# Altium footprint library MOLEX THD.PcbLib: 71 footprints (part 2 of 5)
Each footprint in its own frame and in the unit in brackets; x right, y up, seen from the top. Pads: shape width x height; smd on the part's side, far side on the other; paste and mask are expansions set on the pad; w line width, h text height; cw(c..) or ccw(c..) is an arc to the next point about the centre after c.
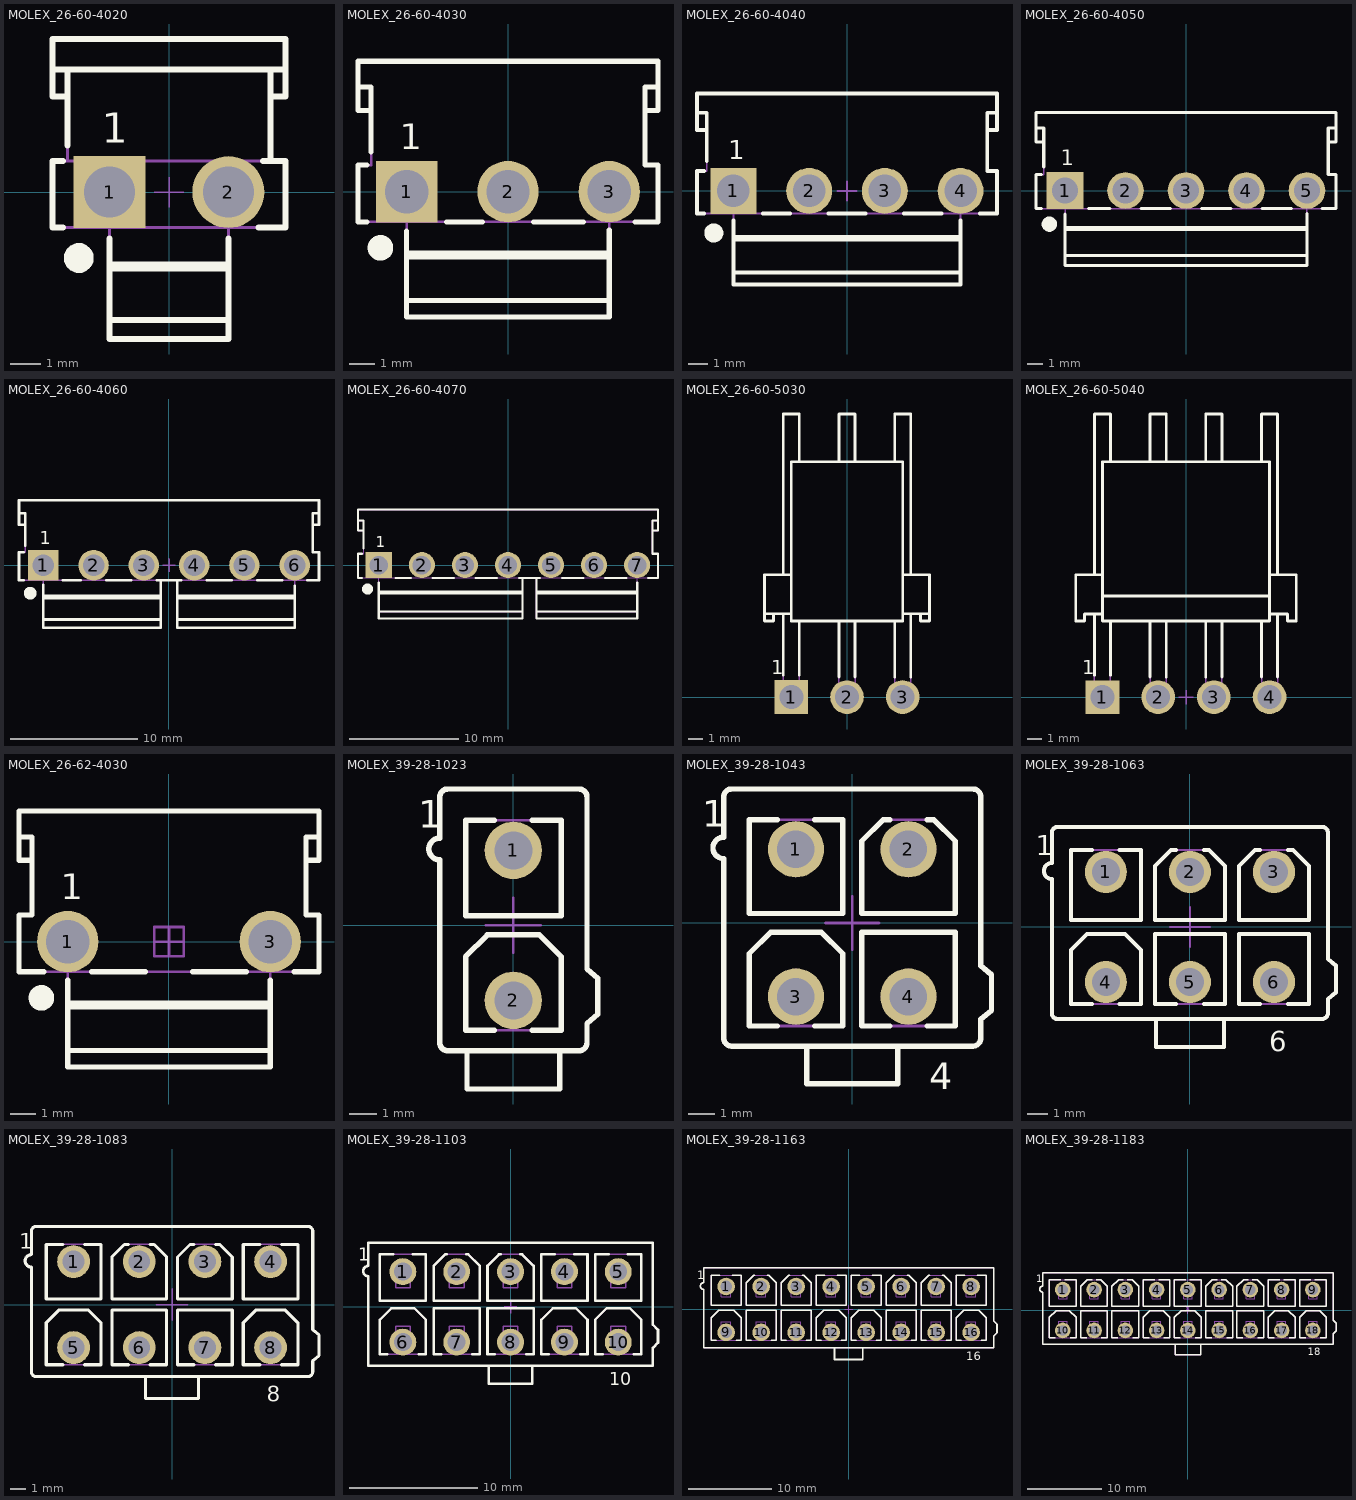
[diagram p1: the footprints below, top view; thin cyan lines are the x and y axes]

## MOLEX_26-60-4020 [mm] "3.96mm (.156\") Pitch KK® Solid Header, Vertical, Friction Lock, 2 Circuits, Tin (Sn) Plating"
height 14.73
pads (2):
  rect 2.4x2.4 hole 1.7: 1(-1.981,0)
  round 2.4 hole 1.7: 2(1.981,0)
Top Overlay:
  circle w0.5: c-3.011,-2.2 r0.25
  lines w0.2: -3.886,4.089 3.886,4.089 ; -3.531,-1.181 -3.886,-1.181 -3.886,1.041 -3.531,1.041 ; -3.378,1.55 -3.378,4.089 ; -3.378,3.182 -3.886,3.182 -3.886,5.105 3.886,5.105 3.886,3.182 3.378,3.182 ; -1.981,-4.267 1.981,-4.267 ; -1.981,-2.548 1.981,-2.548 ; -1.981,-2.413 1.981,-2.413 ; -1.981,-1.55 -1.981,-4.902 1.981,-4.902 1.981,-1.55 ; 2.985,-1.181 3.886,-1.181 3.886,1.041 3.129,1.041 ; 3.378,1.041 3.378,4.089
  text "1" at -2.249,1.65 h1
Mechanical 8:
  lines w0.05: -2.481,0 -1.981,0 ; -1.981,-0.5 -1.981,0 ; -1.981,0.5 -1.981,0 ; -1.481,0 -1.981,0 ; -0.5,0 0,0 ; 0,-0.5 0,0 ; 0,0.5 0,0 ; 0.5,0 0,0 ; 1.481,0 1.981,0 ; 1.981,-0.5 1.981,0 ; 1.981,0.5 1.981,0 ; 2.481,0 1.981,0
Mechanical 14:
  lines w0.1: -3.886,4.089 3.886,4.089 ; -3.378,1.041 -3.378,4.089 ; -3.378,3.182 -3.886,3.182 -3.886,5.105 3.886,5.105 3.886,3.182 3.378,3.182 ; -1.981,-4.267 1.981,-4.267 ; -1.981,-2.548 1.981,-2.548 ; -1.981,-2.413 1.981,-2.413 ; -1.981,-1.181 -1.981,-4.902 1.981,-4.902 1.981,-1.181 ; 3.378,1.041 3.378,4.089 ; -3.886,-1.181 -3.886,1.041 3.886,1.041 3.886,-1.181 -3.886,-1.181 ; -2.552,-0.571 -2.552,0.571 -1.41,0.571 -1.41,-0.571 -2.552,-0.571 ; 1.408,-0.571 1.408,0.571 2.55,0.571 2.55,-0.571 1.408,-0.571
  text "1" at -2.249,1.65 h1
3D body "MOLEX_26-60-4020.stp": height 14.73, standoff -3.56, extent -3.886,-4.902 3.886,5.105

## MOLEX_26-60-4030 [mm] "3.96mm (.156\") Pitch KK® Solid Header, Vertical, Friction Lock, 3 Circuits, Tin (Sn) Plating"
height 14.73
pads (3):
  rect 2.4x2.4 hole 1.7: 1(-3.96,0)
  round 2.4 hole 1.7: 2(0,0) 3(3.96,0)
Top Overlay:
  circle w0.5: c-4.99,-2.2 r0.25
  lines w0.2: -5.869,4.089 -5.361,4.089 -5.361,3.181 ; -5.869,5.105 -5.869,3.181 -5.361,3.181 ; -5.864,5.102 5.864,5.102 5.864,3.18 5.356,3.18 ; -5.51,-1.181 -5.869,-1.181 -5.869,1.041 -5.51,1.041 ; -5.361,1.55 -5.361,3.181 ; -3.964,-4.898 -3.964,-1.55 ; -3.96,-4.899 3.96,-4.899 3.96,-1.5 ; -3.96,-4.265 3.96,-4.265 ; -3.96,-2.546 3.96,-2.546 ; -3.96,-2.412 3.96,-2.412 ; -2.41,-1.181 -1.003,-1.181 ; 1.003,-1.181 2.957,-1.181 ; 4.963,-1.181 5.869,-1.181 ; 5.864,-1.18 5.864,1.041 5.356,1.041 5.356,4.087 5.864,4.087
  text "1" at -4.228,1.65 h1
Mechanical 8:
  lines w0.1: -4.46,0 -3.96,0 ; -3.96,-0.5 -3.96,0 ; -3.96,0.5 -3.96,0 ; -3.46,0 -3.96,0 ; -0.5,0 0,0 ; 0,-0.5 0,0 ; 0,0.5 0,0 ; 0.5,0 0,0 ; 3.46,0 3.96,0 ; 3.96,-0.5 3.96,0 ; 3.96,0.5 3.96,0 ; 4.46,0 3.96,0
Mechanical 14:
  lines w0.1: -5.864,4.087 -5.356,4.087 -5.356,1.041 -5.864,1.041 -5.864,-1.18 5.864,-1.18 5.864,1.041 5.356,1.041 5.356,4.087 5.864,4.087 ; -5.356,3.18 -5.864,3.18 -5.864,5.102 5.864,5.102 5.864,3.18 5.356,3.18 ; -3.96,-4.265 3.96,-4.265 ; -3.96,-2.546 3.96,-2.546 ; -3.96,-2.412 3.96,-2.412 ; -3.96,-1.18 -3.96,-4.899 3.96,-4.899 3.96,-1.18 ; -4.531,-0.571 -4.531,0.571 -3.389,0.571 -3.389,-0.571 -4.531,-0.571 ; -0.571,-0.571 -0.571,0.571 0.571,0.571 0.571,-0.571 -0.571,-0.571 ; 3.389,-0.571 3.389,0.571 4.531,0.571 4.531,-0.571 3.389,-0.571
  text "1" at -4.228,1.65 h1
3D body "MOLEX_26-60-4030.stp": height 14.73, standoff -3.56, extent -5.864,-4.899 5.871,5.108

## MOLEX_26-60-4040 [mm] "3.96mm (.156\") Pitch KK® Solid Header, Vertical, Friction Lock, 4 Circuits, Tin (Sn) Plating"
height 14.73
pads (4):
  rect 2.4x2.4 hole 1.7: 1(-5.94,0)
  round 2.4 hole 1.7: 2(-1.98,0) 3(1.98,0) 4(5.94,0)
Top Overlay:
  circle w0.5: c-6.97,-2.2 r0.25
  lines w0.2: -7.849,4.089 -7.341,4.089 -7.341,3.181 ; -7.49,-1.181 -7.849,-1.181 -7.849,1.041 -7.49,1.041 ; -7.341,1.55 -7.341,3.181 ; -5.944,-4.268 5.944,-4.268 ; -5.944,-2.548 5.944,-2.548 ; -5.944,-2.413 5.944,-2.413 ; -5.944,-1.55 -5.944,-4.898 5.944,-4.903 5.944,-1.55 ; -4.39,-1.181 -2.983,-1.181 ; -0.977,-1.181 0.977,-1.181 ; 2.983,-1.181 4.937,-1.181 ; 6.943,-1.181 7.849,-1.181 7.849,1.041 7.341,1.041 7.341,3.181 ; 7.849,4.089 7.341,4.089 7.341,3.181 ; -7.341,3.181 -7.849,3.181 -7.849,5.105 7.849,5.105 7.849,3.181 7.341,3.181
  text "1" at -6.208,1.65 h1
Mechanical 8:
  lines w0.1: -6.44,0 -5.94,0 ; -5.94,-0.5 -5.94,0 ; -5.94,0.5 -5.94,0 ; -5.44,0 -5.94,0 ; -2.48,0 -1.98,0 ; -1.98,-0.5 -1.98,0 ; -1.98,0.5 -1.98,0 ; -1.48,0 -1.98,0 ; -0.5,0 0,0 ; 0,-0.5 0,0 ; 0,0.5 0,0 ; 0.5,0 0,0 ; 1.48,0 1.98,0 ; 1.98,-0.5 1.98,0 ; 1.98,0.5 1.98,0 ; 2.48,0 1.98,0 ; 5.44,0 5.94,0 ; 5.94,-0.5 5.94,0 ; 5.94,0.5 5.94,0 ; 6.44,0 5.94,0
Mechanical 14:
  lines w0.1: -7.849,4.089 -7.341,4.089 -7.341,3.181 ; -5.944,-4.268 5.944,-4.268 ; -5.944,-2.548 5.944,-2.548 ; -5.944,-2.413 5.944,-2.413 ; 7.849,4.089 7.341,4.089 7.341,3.181 ; -7.341,3.181 -7.849,3.181 -7.849,5.105 7.849,5.105 7.849,3.181 7.341,3.181 ; -7.341,3.181 -7.341,1.041 -7.849,1.041 -7.849,-1.181 -5.944,-1.181 ; -5.944,-1.181 5.944,-1.181 ; -5.944,-1.181 -5.944,-4.898 5.944,-4.903 5.944,-1.181 ; 5.944,-1.181 7.849,-1.181 7.849,1.041 7.341,1.041 7.341,3.181
  text "1" at -6.208,1.65 h1
3D body "MOLEX_26-60-4040.stp": height 14.73, standoff -3.54, extent -7.849,-4.902 7.849,5.105

## MOLEX_26-60-4050 [mm] "3.96mm (.156\") Pitch KK® Solid Header, Vertical, Friction Lock, 5 Circuits, Tin (Sn) Plating"
height 14.73
pads (5):
  rect 2.4x2.4 hole 1.7: 1(-7.92,0)
  round 2.4 hole 1.7: 2(-3.96,0) 3(0,0) 4(3.96,0) 5(7.92,0)
Top Overlay:
  circle w0.5: c-8.95,-2.2 r0.25
  lines w0.2: -9.824,4.087 -9.316,4.087 -9.316,1.55 ; -9.47,-1.18 -9.824,-1.18 -9.824,1.041 -9.47,1.041 ; -9.316,3.18 -9.824,3.18 -9.824,5.102 9.824,5.102 9.824,3.18 9.316,3.18 ; -7.92,-4.265 7.92,-4.265 ; -7.92,-2.546 7.92,-2.546 ; -7.92,-2.412 7.92,-2.412 ; -7.92,-1.55 -7.92,-4.899 7.92,-4.899 7.92,-1.5 ; -6.37,-1.18 -4.965,-1.18 ; -2.955,-1.18 -1.005,-1.18 ; 1.005,-1.18 2.955,-1.18 ; 4.965,-1.18 6.915,-1.18 ; 8.925,-1.18 9.824,-1.18 9.824,1.041 9.316,1.041 9.316,4.087 9.824,4.087
  text "1" at -8.188,1.65 h1
Mechanical 8:
  lines w0.1: -8.42,0 -7.92,0 ; -7.92,-0.5 -7.92,0 ; -7.92,0.5 -7.92,0 ; -7.42,0 -7.92,0 ; -4.46,0 -3.96,0 ; -3.96,-0.5 -3.96,0 ; -3.96,0.5 -3.96,0 ; -3.46,0 -3.96,0 ; -0.5,0 0,0 ; 0,-0.5 0,0 ; 0,0.5 0,0 ; 0.5,0 0,0 ; 3.46,0 3.96,0 ; 3.96,-0.5 3.96,0 ; 3.96,0.5 3.96,0 ; 4.46,0 3.96,0 ; 7.42,0 7.92,0 ; 7.92,-0.5 7.92,0 ; 7.92,0.5 7.92,0 ; 8.42,0 7.92,0
Mechanical 14:
  lines w0.1: -9.824,4.087 -9.316,4.087 -9.316,1.041 -9.824,1.041 -9.824,-1.18 9.824,-1.18 9.824,1.041 9.316,1.041 9.316,4.087 9.824,4.087 ; -9.316,3.18 -9.824,3.18 -9.824,5.102 9.824,5.102 9.824,3.18 9.316,3.18 ; -7.92,-4.265 7.92,-4.265 ; -7.92,-2.546 7.92,-2.546 ; -7.92,-2.412 7.92,-2.412 ; -7.92,-1.18 -7.92,-4.899 7.92,-4.899 7.92,-1.18 ; -8.491,-0.571 -7.349,-0.571 -7.349,0.571 -8.491,0.571 -8.491,-0.571 ; -4.531,-0.571 -3.389,-0.571 -3.389,0.571 -4.531,0.571 -4.531,-0.571 ; -0.571,-0.571 0.571,-0.571 0.571,0.571 -0.571,0.571 -0.571,-0.571 ; 3.389,-0.571 4.531,-0.571 4.531,0.571 3.389,0.571 3.389,-0.571 ; 7.349,-0.571 8.491,-0.571 8.491,0.571 7.349,0.571 7.349,-0.571
  text "1" at -8.188,1.65 h1
3D body "MOLEX_26-60-4050.stp": height 14.72, standoff -3.55, extent -9.824,-4.899 9.824,5.102

## MOLEX_26-60-4060 [mm] "3.96mm (.156\") Pitch KK® Solid Header, Vertical, Friction Lock, 6 Circuits, Tin (Sn) Plating"
height 14.73
pads (6):
  rect 2.4x2.4 hole 1.7: 1(-9.9,0)
  round 2.4 hole 1.7: 2(-5.94,0) 3(-1.98,0) 4(1.98,0) 5(5.94,0) 6(9.9,0)
Top Overlay:
  circle w0.5: c-10.93,-2.2 r0.25
  lines w0.2: -11.811,4.089 -11.303,4.089 -11.303,1.55 ; -11.45,-1.181 -11.811,-1.181 -11.811,1.041 -11.45,1.041 ; -11.303,3.182 -11.811,3.182 -11.811,3.216 -11.811,5.105 11.811,5.105 11.811,3.182 11.303,3.182 ; -9.906,-4.267 -0.635,-4.267 ; -9.906,-2.599 -0.635,-2.599 ; -9.906,-2.413 -0.635,-2.413 ; -9.906,-1.55 -9.906,-4.902 -0.635,-4.902 -0.635,-1.181 ; -8.35,-1.181 -6.944,-1.181 ; -4.936,-1.181 -2.984,-1.181 ; -0.976,-1.181 0.976,-1.181 ; 0.635,-4.267 9.906,-4.267 ; 0.635,-2.599 9.906,-2.599 ; 0.635,-2.413 9.906,-2.413 ; 0.635,-1.181 0.635,-4.902 9.906,-4.902 9.906,-1.6 ; 2.984,-1.181 4.936,-1.181 ; 6.944,-1.181 8.896,-1.181 ; 10.904,-1.181 11.811,-1.181 11.811,1.041 11.303,1.041 11.303,4.089 11.811,4.089
  text "1" at -10.168,1.65 h1
Mechanical 8:
  lines w0.1: -10.4,0 -9.9,0 ; -9.9,-0.5 -9.9,0 ; -9.9,0.5 -9.9,0 ; -9.4,0 -9.9,0 ; -6.44,0 -5.94,0 ; -5.94,-0.5 -5.94,0 ; -5.94,0.5 -5.94,0 ; -5.44,0 -5.94,0 ; -2.48,0 -1.98,0 ; -1.98,-0.5 -1.98,0 ; -1.98,0.5 -1.98,0 ; -1.48,0 -1.98,0 ; -0.5,0 0,0 ; 0,-0.5 0,0 ; 0,0.5 0,0 ; 0.5,0 0,0 ; 1.48,0 1.98,0 ; 1.98,-0.5 1.98,0 ; 1.98,0.5 1.98,0 ; 2.48,0 1.98,0 ; 5.44,0 5.94,0 ; 5.94,-0.5 5.94,0 ; 5.94,0.5 5.94,0 ; 6.44,0 5.94,0 ; 9.4,0 9.9,0 ; 9.9,-0.5 9.9,0 ; 9.9,0.5 9.9,0 ; 10.4,0 9.9,0
Mechanical 14:
  lines w0.1: -11.811,4.089 -11.303,4.089 -11.303,1.041 -11.811,1.041 -11.811,-1.181 11.811,-1.181 11.811,1.041 11.303,1.041 11.303,4.089 11.811,4.089 ; -11.303,3.182 -11.811,3.182 -11.811,3.216 -11.811,5.105 11.811,5.105 11.811,3.182 11.303,3.182 ; -9.906,-4.267 -0.635,-4.267 ; -9.906,-2.599 -0.635,-2.599 ; -9.906,-2.413 -0.635,-2.413 ; -9.906,-1.181 -9.906,-4.902 -0.635,-4.902 -0.635,-1.181 ; 0.635,-4.267 9.906,-4.267 ; 0.635,-2.599 9.906,-2.599 ; 0.635,-2.413 9.906,-2.413 ; 0.635,-1.181 0.635,-4.902 9.906,-4.902 9.906,-1.181 ; -10.477,-0.572 -9.334,-0.572 -9.334,0.572 -10.477,0.572 -10.477,-0.572 ; -6.515,-0.572 -5.372,-0.572 -5.372,0.572 -6.515,0.572 -6.515,-0.572 ; -2.553,-0.572 -1.41,-0.572 -1.41,0.572 -2.553,0.572 -2.553,-0.572 ; 1.41,-0.572 2.553,-0.572 2.553,0.572 1.41,0.572 1.41,-0.572 ; 5.372,-0.572 6.515,-0.572 6.515,0.572 5.372,0.572 5.372,-0.572 ; 9.335,-0.572 10.478,-0.572 10.478,0.572 9.335,0.572 9.335,-0.572
  text "1" at -10.168,1.65 h1
3D body "MOLEX_26-60-4060.stp": height 14.73, standoff -3.56, extent -11.811,-4.902 11.811,5.106

## MOLEX_26-60-4070 [mm] "3.96mm (.156\") Pitch KK® Solid Header, Vertical, Friction Lock, 7 Circuits, Tin (Sn) Plating"
height 14.73
pads (7):
  rect 2.4x2.4 hole 1.7: 1(-11.887,0)
  round 2.4 hole 1.7: 2(-7.927,0) 3(-3.967,0) 4(-0.007,0) 5(3.953,0) 6(7.913,0) 7(11.875,0)
Top Overlay:
  circle w0.5: c-12.917,-2.2 r0.25
  lines w0.2: -13.799,4.089 -13.291,4.089 -13.291,1.55 ; -13.444,-1.181 -13.799,-1.181 -13.799,1.041 -13.444,1.041 ; -13.291,3.182 -13.799,3.182 -13.799,5.105 13.785,5.105 13.785,3.182 13.277,3.182 ; -11.894,-4.267 1.339,-4.267 ; -11.894,-2.599 1.339,-2.599 ; -11.894,-2.413 1.339,-2.413 ; -11.894,-1.6 -11.894,-4.902 1.339,-4.902 1.339,-1.181 ; -10.344,-1.181 -8.936,-1.181 ; -6.928,-1.181 -4.973,-1.181 ; -2.966,-1.181 -1.011,-1.181 ; 0.997,-1.181 2.951,-1.181 ; 2.609,-4.267 11.88,-4.267 ; 2.609,-2.599 11.88,-2.599 ; 2.609,-2.413 11.88,-2.413 ; 2.609,-1.181 2.609,-4.902 11.88,-4.902 11.88,-1.6 ; 4.959,-1.181 6.914,-1.181 ; 8.921,-1.181 10.876,-1.181 ; 12.884,-1.181 13.785,-1.181 13.785,1.041 13.277,1.041 13.277,4.089 13.785,4.089
  text "1" at -12.155,1.65 h1
Mechanical 8:
  lines w0.1: -12.387,0 -11.887,0 ; -11.887,-0.5 -11.887,0 ; -11.887,0.5 -11.887,0 ; -11.387,0 -11.887,0 ; -8.425,0 -7.925,0 ; -7.925,-0.5 -7.925,0 ; -7.925,0.5 -7.925,0 ; -7.425,0 -7.925,0 ; -4.462,0 -3.962,0 ; -3.962,-0.5 -3.962,0 ; -3.962,0.5 -3.962,0 ; -3.462,0 -3.962,0 ; -0.5,0 0,0 ; 0,-0.5 0,0 ; 0,0.5 0,0 ; 0.5,0 0,0 ; 3.462,0 3.962,0 ; 3.962,-0.5 3.962,0 ; 3.962,0.5 3.962,0 ; 4.462,0 3.962,0 ; 7.425,0 7.925,0 ; 7.925,-0.5 7.925,0 ; 7.925,0.5 7.925,0 ; 8.425,0 7.925,0 ; 11.387,0 11.887,0 ; 11.887,-0.5 11.887,0 ; 11.887,0.5 11.887,0 ; 12.387,0 11.887,0
Mechanical 14:
  lines w0.1: -13.792,4.089 -13.284,4.089 -13.284,1.041 -13.792,1.041 -13.792,-1.181 13.792,-1.181 13.792,1.041 13.284,1.041 13.284,4.089 13.792,4.089 ; -13.284,3.182 -13.792,3.182 -13.792,5.105 13.792,5.105 13.792,3.182 13.284,3.182 ; -11.887,-4.267 1.346,-4.267 ; -11.887,-2.599 1.346,-2.599 ; -11.887,-2.413 1.346,-2.413 ; -11.887,-1.181 -11.887,-4.902 1.346,-4.902 1.346,-1.181 ; 2.616,-4.267 11.887,-4.267 ; 2.616,-2.599 11.887,-2.599 ; 2.616,-2.413 11.887,-2.413 ; 2.616,-1.181 2.616,-4.902 11.887,-4.902 11.887,-1.181 ; -12.458,-0.571 -11.316,-0.571 -11.316,0.571 -12.458,0.571 -12.458,-0.571 ; -8.498,-0.571 -7.356,-0.571 -7.356,0.571 -8.498,0.571 -8.498,-0.571 ; -4.538,-0.571 -3.396,-0.571 -3.396,0.571 -4.538,0.571 -4.538,-0.571 ; -0.578,-0.571 0.564,-0.571 0.564,0.571 -0.578,0.571 -0.578,-0.571 ; 3.382,-0.571 4.524,-0.571 4.524,0.571 3.382,0.571 3.382,-0.571 ; 7.344,-0.571 7.344,0.571 8.486,0.571 8.486,-0.571 7.344,-0.571 ; 11.294,-0.571 11.294,0.571 12.437,0.571 12.437,-0.571 11.294,-0.571
  text "1" at -12.155,1.65 h1
3D body "MOLEX_26-60-4070.stp": height 14.72, standoff -3.56, extent -13.792,-4.902 13.792,5.105

## MOLEX_26-60-5030 [mm] "3 Circuits, 3.96mm (.156) Pitch KK® Wire-To-Board Right Angle Header With Friction Lock"
height 10.52
pads (3):
  rect 2.4x2.4 hole 1.7: 1(-3.96,0)
  round 2.4 hole 1.7: 2(0,-0.005) 3(3.96,0)
Top Overlay:
  lines w0.2: -5.867,5.913 -3.962,5.926 ; -5.232,5.913 -5.232,5.405 -5.867,5.405 -5.867,8.707 -3.962,8.707 ; -4.534,1.545 -4.534,5.913 ; -4.534,8.707 -4.534,20.137 -3.391,20.137 -3.391,16.734 ; -3.391,1.545 -3.391,5.405 ; -0.572,1.436 -0.572,5.405 ; -0.572,16.734 -0.572,20.137 0.571,20.137 0.571,16.734 ; 0.571,1.436 0.571,5.405 ; 3.391,1.437 3.391,5.405 ; 3.391,16.734 3.391,20.137 4.534,20.137 4.534,8.707 ; 3.962,5.926 5.867,5.913 ; 3.962,8.707 5.867,8.707 5.867,5.405 5.232,5.405 5.232,5.913 ; 4.534,1.435 4.534,5.913 ; -3.962,5.405 -3.962,16.734 3.962,16.734 3.962,5.405 -3.962,5.405
  text "1" at -5.405,1.615 h1
Mechanical 8:
  lines w0.1: -4.46,-0.005 -3.96,-0.005 ; -3.96,-0.505 -3.96,-0.005 ; -3.96,0.495 -3.96,-0.005 ; -3.46,-0.005 -3.96,-0.005 ; -0.5,-0.005 0,-0.005 ; 0,-0.505 0,-0.005 ; 0,0.495 0,-0.005 ; 0.5,-0.005 0,-0.005 ; 3.46,-0.005 3.96,-0.005 ; 3.96,-0.505 3.96,-0.005 ; 3.96,0.495 3.96,-0.005 ; 4.46,-0.005 3.96,-0.005
Mechanical 14:
  lines w0.1: -5.867,5.913 -3.962,5.926 ; -5.232,5.913 -5.232,5.405 -5.867,5.405 -5.867,8.707 -3.962,8.707 ; -4.534,5.913 -4.534,-0.576 -3.391,-0.576 -3.391,5.405 ; -4.534,8.707 -4.534,20.137 -3.391,20.137 -3.391,16.734 ; -0.572,5.405 -0.572,-0.576 0.571,-0.576 0.571,5.405 ; -0.572,16.734 -0.572,20.137 0.571,20.137 0.571,16.734 ; 3.391,5.405 3.391,-0.576 4.534,-0.576 4.534,5.913 ; 3.391,16.734 3.391,20.137 4.534,20.137 4.534,8.707 ; 3.962,5.926 5.867,5.913 ; 3.962,8.707 5.867,8.707 5.867,5.405 5.232,5.405 5.232,5.913 ; -3.962,5.405 3.962,5.405 3.962,16.734 -3.962,16.734 -3.962,5.405
  text "1" at -5.405,1.615 h1
3D body "MOLEX_26-60-5030.stp": height 10.01, standoff -3.96, extent -5.867,-0.576 5.867,20.137

## MOLEX_26-60-5040 [mm] "3.96mm (.156\") Pitch KK® Solid Header,Right Angle, 4 Circuits, Tin (Sn) Plating"
height 9
pads (4):
  rect 2.4x2.4 hole 1.7: 1(-5.944,0)
  round 2.4 hole 1.7: 2(-1.981,0) 3(1.981,0) 4(5.944,0)
Top Overlay:
  lines w0.2: -6.515,1.55 -6.515,5.918 ; -6.515,8.712 -6.515,20.142 -5.372,20.142 -5.372,16.739 ; -5.944,5.918 -7.214,5.918 -7.214,5.41 -7.849,5.41 -7.849,8.712 -5.944,8.712 ; -5.944,7.188 5.944,7.188 ; -5.372,1.55 -5.372,5.41 ; -2.553,1.441 -2.553,5.41 ; -2.553,16.739 -2.553,20.142 -1.41,20.142 -1.41,16.739 ; -1.41,1.441 -1.41,5.41 ; 1.41,1.441 1.41,5.41 ; 1.41,16.739 1.41,20.142 2.553,20.142 2.553,16.739 ; 2.553,1.441 2.553,5.41 ; 5.372,1.441 5.372,5.41 ; 5.372,16.739 5.372,20.142 6.515,20.142 6.515,8.712 ; 5.944,5.918 7.214,5.918 7.214,5.41 7.849,5.41 7.849,8.712 5.944,8.712 ; 6.515,1.441 6.515,5.918 ; -5.944,5.41 5.944,5.41 5.944,16.739 -5.944,16.739 -5.944,5.41
  text "1" at -7.388,1.62 h1
Mechanical 8:
  lines w0.1: -6.444,0 -5.944,0 ; -5.944,-0.5 -5.944,0 ; -5.944,0.5 -5.944,0 ; -5.444,0 -5.944,0 ; -2.481,0 -1.981,0 ; -1.981,-0.5 -1.981,0 ; -1.981,0.5 -1.981,0 ; -1.481,0 -1.981,0 ; -0.5,0 0,0 ; 0,-0.5 0,0 ; 0,0.5 0,0 ; 0.5,0 0,0 ; 1.481,0 1.981,0 ; 1.981,-0.5 1.981,0 ; 1.981,0.5 1.981,0 ; 2.481,0 1.981,0 ; 5.444,0 5.944,0 ; 5.944,-0.5 5.944,0 ; 5.944,0.5 5.944,0 ; 6.444,0 5.944,0
Mechanical 14:
  lines w0.1: -6.515,5.918 -6.515,-0.572 ; -6.515,8.712 -6.515,20.142 -5.372,20.142 -5.372,16.739 ; -5.944,5.918 -7.214,5.918 -7.214,5.41 -7.849,5.41 -7.849,8.712 -5.944,8.712 ; -5.944,7.188 5.944,7.188 ; -5.372,5.41 -5.372,-0.572 ; -2.553,5.41 -2.553,-0.572 -1.41,-0.572 -1.41,5.41 ; -2.553,16.739 -2.553,20.142 -1.41,20.142 -1.41,16.739 ; 1.41,5.41 1.41,-0.572 2.553,-0.572 2.553,5.41 ; 1.41,16.739 1.41,20.142 2.553,20.142 2.553,16.739 ; 5.372,5.41 5.372,-0.572 6.515,-0.572 6.515,5.918 ; 5.372,16.739 5.372,20.142 6.515,20.142 6.515,8.712 ; 5.944,5.918 7.214,5.918 7.214,5.41 7.849,5.41 7.849,8.712 5.944,8.712 ; -6.515,-0.572 -5.372,-0.572 ; -6.515,-0.572 -5.372,-0.572 ; -5.944,5.41 5.944,5.41 5.944,16.739 -5.944,16.739 -5.944,5.41
  text "1" at -7.388,1.62 h1
3D body "MOLEX_26-60-5040.stp": height 10.01, standoff -3.96, extent -7.849,-0.571 7.849,20.142
